# Altium footprint library C210 Rev_D_221221a.PcbLib: 89 footprints (part 5 of 6)
Each footprint in its own frame and in the unit in brackets; x right, y up, seen from the top. Pads: shape width x height; smd on the part's side, far side on the other; paste and mask are expansions set on the pad; w line width, h text height; cw(c..) or ccw(c..) is an arc to the next point about the centre after c.
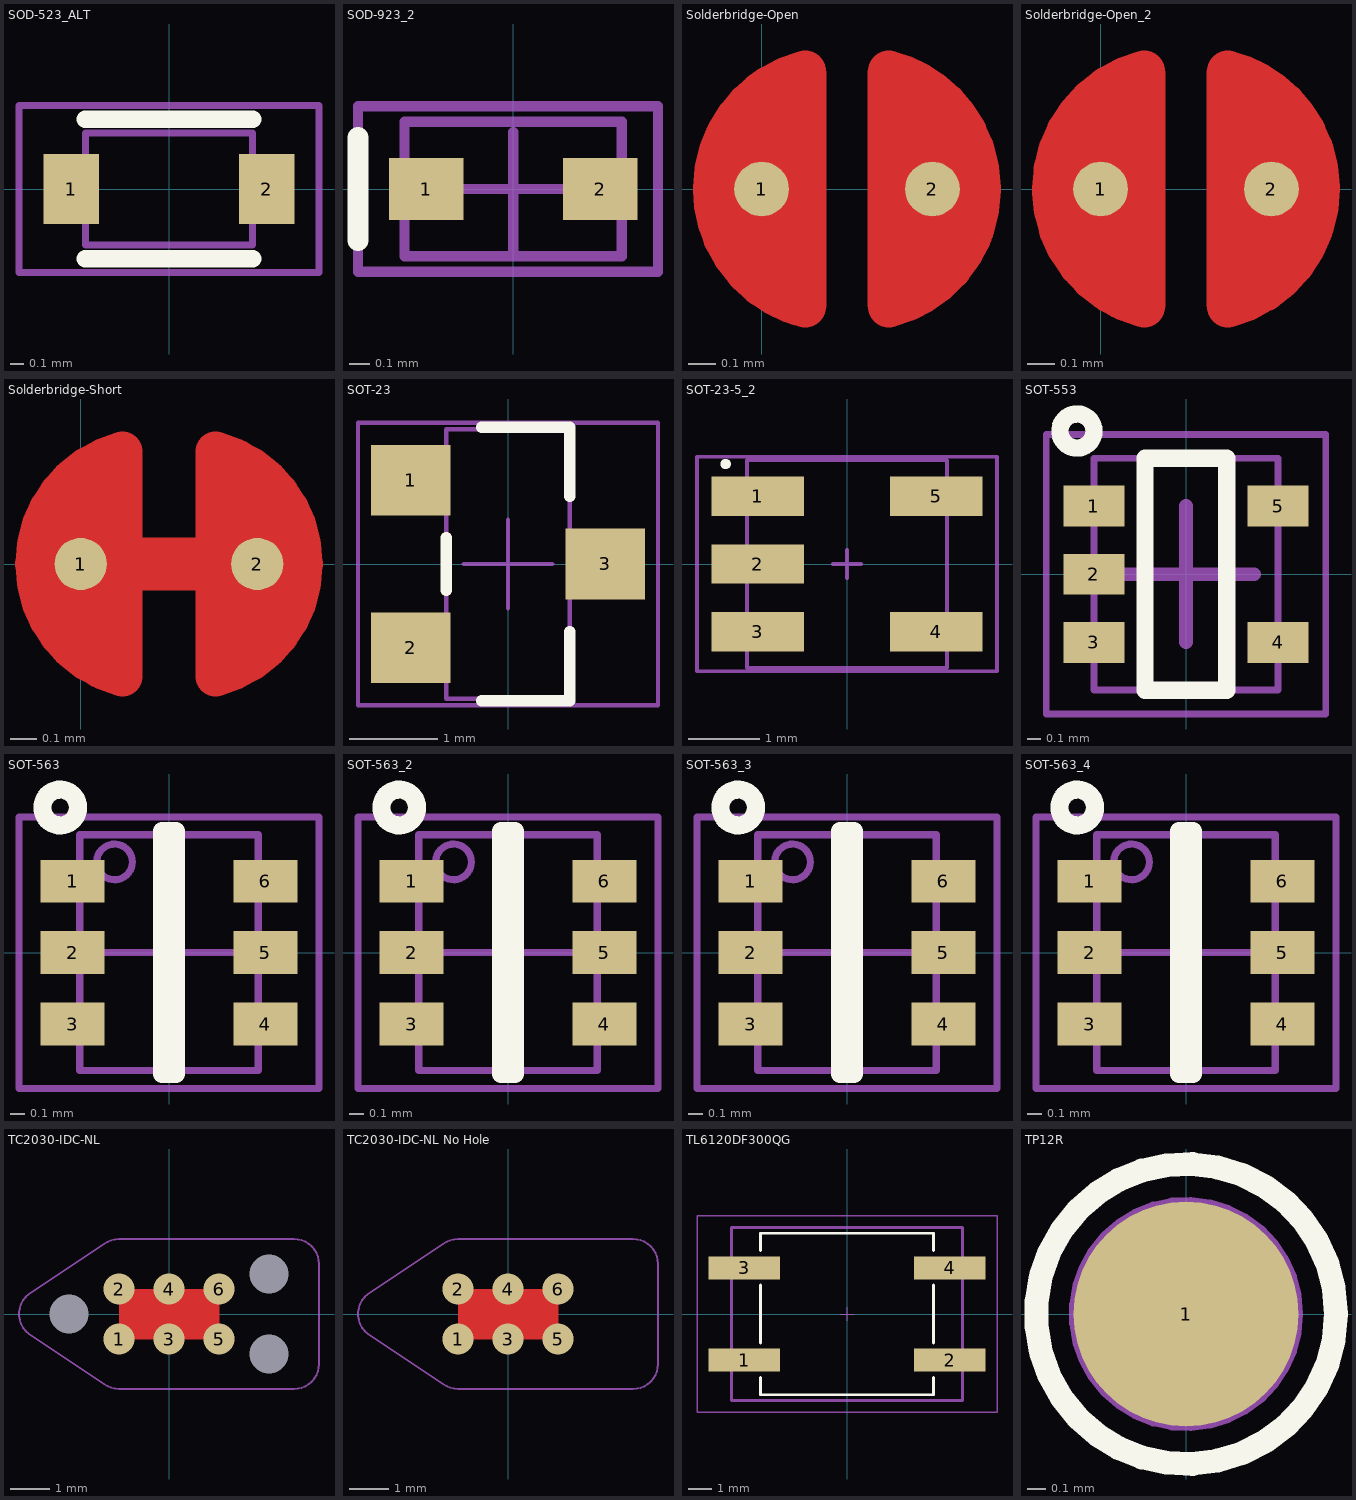
[diagram p4: the footprints below, top view; thin cyan lines are the x and y axes]

## SOD-523_ALT [mm]
pads (2):
  rect 0.4x0.5 smd: 1(-0.7,0) 2(0.7,0)
Top Overlay:
  lines w0.127: -0.6,-0.5 0.6,-0.5 ; -0.6,0.5 0.6,0.5
Mechanical 11:
  text ".Designator" at -0.475,-0.2 h0.5
Mechanical 13:
  lines w0.05: -0.6,-0.4 0.6,-0.4 0.6,0.4 -0.6,0.4 -0.6,-0.4
Mechanical 15:
  lines w0.05: -1.075,-0.6 -1.075,0.6 1.075,0.6 1.075,-0.6 -1.075,-0.6
3D body "User Library-SOD-523F.step": height 0.7, standoff 0, extent -0.8,-0.399 0.8,0.399

## SOD-923_2 [mm]
pads (2):
  rect 0.36x0.3 smd mask+0.05: 1(-0.42,0) 2(0.42,0)
Top Overlay:
  lines w0.102: -0.75,-0.25 -0.75,0.25
Mechanical 11:
  text ".Designator" at 0.329,0.125 h0.5
Mechanical 13:
  lines w0.05: -0.525,-0.325 0.525,-0.325 0.525,0.325 -0.525,0.325 -0.525,-0.325
Mechanical 15:
  lines w0.05: -0.3,0 0.325,0 ; 0,-0.325 0,0.275 ; -0.75,-0.4 0.7,-0.4 0.7,0.4 -0.75,0.4 -0.75,-0.4
3D body "User Library-DIODE_SOD-923.step": height 0.44, standoff 0.01, extent -0.525,-0.325 0.525,0.325

## Solderbridge-Open [mm]
pads (2):
  round 0.2 smd paste-10: 1(0,0) 2(0.625,0)
Top Layer:
  region: 0.236,-0.432 0.16,-0.505 0.042,-0.467 -0.023,-0.424 -0.097,-0.351 -0.15,-0.292 -0.208,-0.193 -0.236,-0.099 -0.231,0.122 -0.206,0.193 -0.122,0.33 -0.038,0.411 0.054,0.469 0.155,0.5 0.206,0.483 0.236,0.43
  region: 0.389,0.432 0.465,0.505 0.583,0.467 0.648,0.424 0.721,0.351 0.775,0.292 0.833,0.193 0.861,0.099 0.856,-0.122 0.831,-0.193 0.747,-0.33 0.663,-0.411 0.571,-0.469 0.47,-0.5 0.419,-0.483 0.389,-0.43
  lines w0.152: 0.159,-0.431 cw(c0.27,0) 0.11,-0.415 cw(c0.27,0) 0.103,-0.412 cw(c0.27,0) 0,-0.353 cw(c0.27,0) -0.137,-0.178 cw(c0.27,0) -0.175,0 cw(c0.27,0) -0.152,0.139 cw(c0.27,0) 0,0.353 cw(c0.27,0) 0.025,0.371 cw(c0.27,0) 0.159,0.431 ; 0.465,-0.431 ccw(c0.355,0) 0.762,-0.178 ccw(c0.355,0) 0.774,-0.149 ccw(c0.355,0) 0.799,0 ccw(c0.355,0) 0.774,0.149 ccw(c0.355,0) 0.625,0.353 ccw(c0.355,0) 0.465,0.431
Top Solder:
  circle w0.61: c0.31,0 r0.279

## Solderbridge-Open_2 [mm]
pads (2):
  round 0.2 smd paste-10: 1(0,0) 2(0.625,0)
Top Layer:
  region: 0.389,0.432 0.465,0.505 0.583,0.467 0.648,0.424 0.721,0.351 0.775,0.292 0.833,0.193 0.861,0.099 0.856,-0.122 0.831,-0.193 0.747,-0.33 0.663,-0.411 0.571,-0.469 0.47,-0.5 0.419,-0.483 0.389,-0.43
  region: 0.236,-0.432 0.16,-0.505 0.042,-0.467 -0.023,-0.424 -0.097,-0.351 -0.15,-0.292 -0.208,-0.193 -0.236,-0.099 -0.231,0.122 -0.206,0.193 -0.122,0.33 -0.038,0.411 0.054,0.469 0.155,0.5 0.206,0.483 0.236,0.43
  lines w0.152: 0.159,-0.431 cw(c0.27,0) -0.174,-0.009 cw(c0.27,0) -0.175,0 cw(c0.27,0) 0.025,0.371 cw(c0.27,0) 0.159,0.431 ; 0.465,-0.431 ccw(c0.355,0) 0.774,0.149 ccw(c0.355,0) 0.625,0.353 ccw(c0.355,0) 0.465,0.431
Top Solder:
  circle w0.61: c0.31,0 r0.279

## Solderbridge-Short [mm]
pads (2):
  round 0.2 smd paste-10: 1(0,0) 2(0.676,0)
Top Layer:
  region: 0.236,-0.432 0.16,-0.505 0.042,-0.467 -0.023,-0.424 -0.097,-0.351 -0.15,-0.292 -0.208,-0.193 -0.236,-0.099 -0.231,0.122 -0.206,0.193 -0.122,0.33 -0.038,0.411 0.054,0.469 0.155,0.5 0.206,0.483 0.236,0.43
  region: 0.44,0.432 0.516,0.505 0.634,0.467 0.698,0.424 0.772,0.351 0.825,0.292 0.884,0.193 0.912,0.099 0.907,-0.122 0.881,-0.193 0.798,-0.33 0.714,-0.411 0.622,-0.469 0.521,-0.5 0.47,-0.483 0.44,-0.43
  lines w0.152: 0.159,-0.431 cw(c0.27,0) 0.159,0.431 ; 0.516,-0.431 ccw(c0.406,0) 0.516,0.431
  lines w0.203: 0,0 0.676,0
Top Solder:
  circle w0.61: c0.366,0 r0.279
  circle w0.61: c0.31,0 r0.279

## SOT-23 [mm]
pads (3):
  rect 0.9x0.8 smd: 1(-1.1,0.95) 2(-1.1,-0.95) 3(1.1,0)
Top Overlay:
  lines w0.127: -0.7,-0.3 -0.7,0.3 ; -0.3,-1.55 0.7,-1.55 0.7,-0.763 ; -0.3,1.55 0.7,1.55 0.7,0.763
Mechanical 11:
  text ".Designator" at -0.125,0.3 h0.5
Mechanical 13:
  lines w0.05: -0.7,-1.525 -0.7,1.525 0.7,1.525 0.7,-1.525 -0.7,-1.525
Mechanical 15:
  lines w0.05: -0.5,0 0.5,0 ; 0,-0.5 0,0.5 ; -1.7,-1.6 -1.7,1.6 1.7,1.6 1.7,-1.6 -1.7,-1.6
3D body: height 1.2, standoff 0, extent -0.7,-1.525 0.7,1.525

## SOT-23-5_2 [mm]
pads (5):
  rect 1.3x0.55 smd: 1(-1.25,0.95) 2(-1.25,0) 3(-1.25,-0.95) 4(1.25,-0.95) 5(1.25,0.95)
Top Overlay:
  circle w0.127: c-1.7,1.4 r0.01
Mechanical 11:
  text ".Designator" at -0.25,-0.25 h0.5
Mechanical 13:
  lines w0.05: -1.4,-1.45 -1.4,1.45 1.4,1.45 1.4,-1.45 -1.4,-1.45
Mechanical 15:
  lines w0.05: -0.2,0 0.2,0 ; 0,-0.2 0,0.2 ; -2.1,-1.5 2.1,-1.5 2.1,1.5 -2.1,1.5 -2.1,-1.5
3D body "User Library-SOT23-5-2.step": height 1.45, standoff 0, extent -1.4,-1.45 1.4,1.45

## SOT-553 [mm]
pads (5):
  rect 0.45x0.3 smd mask+0.05: 1(-0.675,0.5) 2(-0.675,0) 3(-0.675,-0.5) 4(0.675,-0.5) 5(0.675,0.5)
Top Overlay:
  circle w0.127: c-0.8,1.05 r0.125
  lines w0.127: -0.3,-0.85 -0.3,0.85 0.3,0.85 0.3,-0.85 -0.3,-0.85
Mechanical 11:
  text ".Designator" at 0.25,-0.656 h0.5
Mechanical 13:
  lines w0.05: -0.675,-0.85 0.675,-0.85 0.675,0.85 -0.675,0.85 -0.675,-0.85
Mechanical 15:
  lines w0.05: -1.025,-1.025 1.025,-1.025 1.025,1.025 -1.025,1.025 -1.025,-1.025
  lines w0.1: -0.5,0 0.5,0 ; 0,-0.5 0,0.5
3D body: height 0.6, standoff 0, extent -0.675,-0.85 0.675,0.85

## SOT-563 [mm]
pads (6):
  rect 0.45x0.3 smd: 1(-0.675,0.5) 2(-0.675,0) 3(-0.675,-0.5) 4(0.675,-0.5) 5(0.675,0) 6(0.675,0.5)
Top Overlay:
  circle w0.127: c-0.762,1.016 r0.125
  lines w0.127: -0.05,-0.85 0.05,-0.85 0.05,0.85 -0.05,0.85 -0.05,-0.85
Mechanical 11:
  text ".Designator" at 0.2,-0.7 h0.5
Mechanical 13:
  circle w0.05: c-0.381,0.635 r0.125
  lines w0.05: -0.625,-0.825 -0.625,0.825 0.625,0.825 0.625,-0.825 -0.625,-0.825
Mechanical 15:
  lines w0.05: -0.5,0 0.5,0 ; 0,-0.5 0,0.5 ; -1.05,-0.95 -1.05,0.95 1.05,0.95 1.05,-0.95 -1.05,-0.95
3D body "SOT563.stp": height 0.59, standoff -0.01, extent -0.8,-0.8 0.8,0.8

## SOT-563_2 [mm]
pads (6):
  rect 0.45x0.3 smd: 1(-0.675,0.5) 2(-0.675,0) 3(-0.675,-0.5) 4(0.675,-0.5) 5(0.675,0) 6(0.675,0.5)
Top Overlay:
  circle w0.127: c-0.762,1.016 r0.125
  lines w0.127: -0.05,-0.85 0.05,-0.85 0.05,0.85 -0.05,0.85 -0.05,-0.85
Mechanical 11:
  text ".Designator" at -0.275,0.3 h0.5
Mechanical 13:
  circle w0.05: c-0.381,0.635 r0.125
  lines w0.05: -0.625,-0.825 -0.625,0.825 0.625,0.825 0.625,-0.825 -0.625,-0.825
Mechanical 15:
  lines w0.05: -0.5,0 0.5,0 ; 0,-0.5 0,0.5 ; -1.05,-0.95 -1.05,0.95 1.05,0.95 1.05,-0.95 -1.05,-0.95
3D body: height 0.6, standoff 0, extent -0.625,-0.825 0.625,0.825

## SOT-563_3 [mm]
pads (6):
  rect 0.45x0.3 smd: 1(-0.675,0.5) 2(-0.675,0) 3(-0.675,-0.5) 4(0.675,-0.5) 5(0.675,0) 6(0.675,0.5)
Top Overlay:
  circle w0.127: c-0.762,1.016 r0.125
  lines w0.127: -0.05,-0.85 0.05,-0.85 0.05,0.85 -0.05,0.85 -0.05,-0.85
Mechanical 11:
  text ".Designator" at -0.275,0.675 h0.5
Mechanical 13:
  circle w0.05: c-0.381,0.635 r0.125
  lines w0.05: -0.625,-0.825 -0.625,0.825 0.625,0.825 0.625,-0.825 -0.625,-0.825
Mechanical 15:
  lines w0.05: -0.5,0 0.5,0 ; 0,-0.5 0,0.5 ; -1.05,-0.95 -1.05,0.95 1.05,0.95 1.05,-0.95 -1.05,-0.95
3D body: height 0.6, standoff 0, extent -0.625,-0.825 0.625,0.825

## SOT-563_4 [mm]
pads (6):
  rect 0.45x0.3 smd: 1(-0.675,0.5) 2(-0.675,0) 3(-0.675,-0.5) 4(0.675,-0.5) 5(0.675,0) 6(0.675,0.5)
Top Overlay:
  circle w0.127: c-0.762,1.016 r0.125
  lines w0.127: -0.05,-0.85 0.05,-0.85 0.05,0.85 -0.05,0.85 -0.05,-0.85
Mechanical 11:
  text ".Designator" at 0.162,-0.629 h0.5
Mechanical 13:
  circle w0.05: c-0.381,0.635 r0.125
  lines w0.05: -0.625,-0.825 -0.625,0.825 0.625,0.825 0.625,-0.825 -0.625,-0.825
Mechanical 15:
  lines w0.05: -0.5,0 0.5,0 ; 0,-0.5 0,0.5 ; -1.05,-0.95 -1.05,0.95 1.05,0.95 1.05,-0.95 -1.05,-0.95
3D body: height 0.6, standoff 0, extent -0.625,-0.825 0.625,0.825

## TC2030-IDC-NL [mm]
pads (9):
  round 0.8 smd paste-0.9: 1(-1.27,-0.635) 2(-1.27,0.635) 3(0,-0.635) 4(0,0.635) 5(1.27,-0.635) 6(1.27,0.635)
  round 0 hole 1 unplated paste-1.1: MH1(-2.54,0) MH1(2.54,-1.016) MH1(2.54,1.016)
Top Layer:
  pour cut-out: -1.27,0.635 1.27,0.635 1.27,-0.635 -1.27,-0.635
Mechanical 11:
  text ".Designator" at 0.65,0.225 h0.5
Mechanical 13:
  lines w0.05: -3.556,-0.508 cw(c-3.175,0) -3.556,0.508 -1.651,1.778 cw(c-1.27,1.27) -1.27,1.905 3.175,1.905 cw(c3.175,1.27) 3.81,1.27 3.81,-1.27 cw(c3.175,-1.27) 3.175,-1.905 -1.27,-1.905 cw(c-1.27,-1.27) -1.651,-1.778 -3.556,-0.508
Mechanical 15:
  lines w0.05: -3.556,-0.508 cw(c-3.175,0) -3.556,0.508 -1.651,1.778 cw(c-1.27,1.27) -1.27,1.905 3.175,1.905 cw(c3.175,1.27) 3.81,1.27 3.81,-1.27 cw(c3.175,-1.27) 3.175,-1.905 -1.27,-1.905 cw(c-1.27,-1.27) -1.651,-1.778 -3.556,-0.508
  lines w0.127: -0.254,0 0.254,0 ; 0,-0.254 0,0.254

## TC2030-IDC-NL No Hole [mm]
pads (6):
  round 0.8 smd paste-0.9: 1(-1.27,-0.635) 2(-1.27,0.635) 3(0,-0.635) 4(0,0.635) 5(1.27,-0.635) 6(1.27,0.635)
Top Layer:
  pour cut-out: -1.27,0.635 1.27,0.635 1.27,-0.635 -1.27,-0.635
Mechanical 11:
  text ".Designator" at -1.27,0 h0.5
Mechanical 13:
  lines w0.05: -3.556,-0.508 cw(c-3.175,0) -3.556,0.508 -1.651,1.778 cw(c-1.27,1.27) -1.27,1.905 3.175,1.905 cw(c3.175,1.27) 3.81,1.27 3.81,-1.27 cw(c3.175,-1.27) 3.175,-1.905 -1.27,-1.905 cw(c-1.27,-1.27) -1.651,-1.778 -3.556,-0.508
Mechanical 15:
  lines w0.05: -3.556,-0.508 cw(c-3.175,0) -3.556,0.508 -1.651,1.778 cw(c-1.27,1.27) -1.27,1.905 3.175,1.905 cw(c3.175,1.27) 3.81,1.27 3.81,-1.27 cw(c3.175,-1.27) 3.175,-1.905 -1.27,-1.905 cw(c-1.27,-1.27) -1.651,-1.778 -3.556,-0.508
  lines w0.127: -0.254,0 0.254,0 ; 0,-0.254 0,0.254

## TL6120DF300QG [mm]
pads (4):
  rect 3.1x1 smd: 1(-4.45,-2) 2(4.45,-2) 3(-4.45,2) 4(4.45,2)
Top Overlay:
  lines w0.127: -3.75,-2.75 -3.75,-3.5 3.75,-3.5 3.75,-2.75 ; -3.75,-1.25 -3.75,1.25 ; -3.75,2.75 -3.75,3.5 3.75,3.5 3.75,2.75 ; 3.75,-1.25 3.75,1.25
Mechanical 11:
  text ".Designator" at 0.898,0.031 h0.5
Mechanical 13:
  lines w0.127: -5,-3.75 5,-3.75 5,3.75 -5,3.75 -5,-3.75
Mechanical 15:
  lines w0.05: -0.3,0 0.3,0 ; 0,-0.3 0,0.3
  lines w0.064: -6.5,-4.25 6.5,-4.25 6.5,4.25 -6.5,4.25 -6.5,-4.25
3D body "TL6120DFxxxxG.stp": height 10.01, standoff -0.09, extent -5,-3.7 5,3.7

## TP12R [mm]
pads (1):
  round 1.2 smd paste-10: 1(0,0)
Top Overlay:
  circle w0.127: c0,0 r0.8
Mechanical 11:
  text ".Designator" at 0,0 h0.5
Mechanical 13:
  circle w0.05: c0,0 r0.6
3D body: height 0.05, standoff 0, extent -0.6,-0.6 0.6,0.6